# Altium schematic symbol library Regulator_Switching.SchLib: 1070 symbols (part 9 of 9)
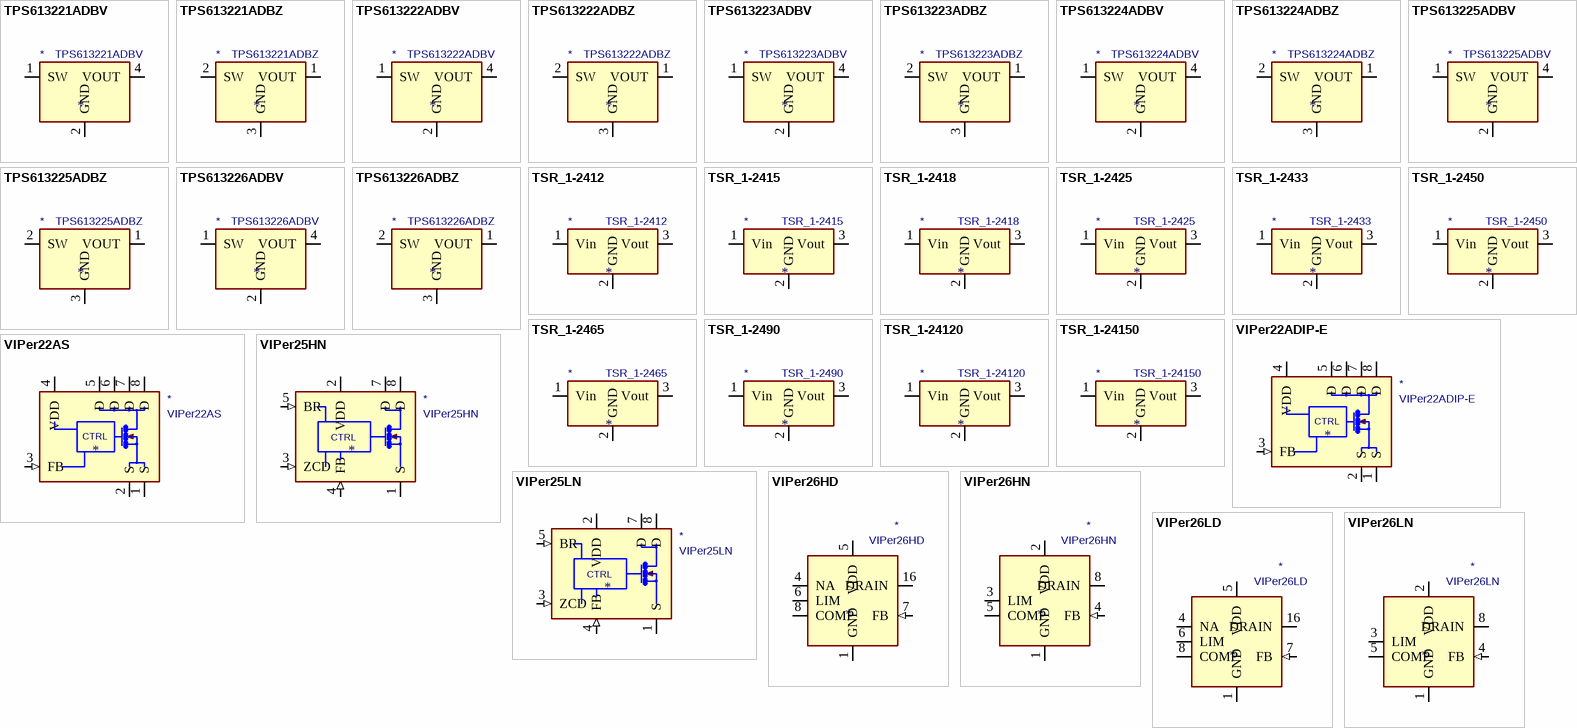
[diagram p34: symbols TPS613221ADBV to VIPer26LN]

## TPS613223ADBV
designator *  value TPS613223ADBV
ki_keywords: Boost converter; ki_description: 750mA Step-Up Converter, 2V Output Voltage, 0.9-5.5V Input Voltage, SOT-23-5; ki_fp_filters: SOT?23*; Footprint: Package_TO_SOT_SMD:SOT-23-5; Supplier: http://www.ti.com/lit/ds/symlink/tps61322.pdf
footprint SOT-23-5
pins: 1 SW (power), 2 GND (power), 3 NC (in) hidden, 4 VOUT (power), 5 NC (in) hidden

## TPS613223ADBZ
designator *  value TPS613223ADBZ
ki_keywords: Boost converter; ki_description: 750mA Step-Up Converter, 2V Output Voltage, 0.9-5.5V Input Voltage, SOT-23; ki_fp_filters: SOT?23*; Footprint: Package_TO_SOT_SMD:SOT-23; Supplier: http://www.ti.com/lit/ds/symlink/tps61322.pdf
footprint SOT-23
pins: 1 VOUT (power), 2 SW (power), 3 GND (power)

## TPS613224ADBV
designator *  value TPS613224ADBV
ki_keywords: Boost converter; ki_description: 750mA Step-Up Converter, 2.5V Output Voltage, 0.9-5.5V Input Voltage, SOT-23-5; ki_fp_filters: SOT?23*; Footprint: Package_TO_SOT_SMD:SOT-23-5; Supplier: http://www.ti.com/lit/ds/symlink/tps61322.pdf
footprint SOT-23-5
pins: 1 SW (power), 2 GND (power), 3 NC (in) hidden, 4 VOUT (power), 5 NC (in) hidden

## TPS613224ADBZ
designator *  value TPS613224ADBZ
ki_keywords: Boost converter; ki_description: 750mA Step-Up Converter, 2.5V Output Voltage, 0.9-5.5V Input Voltage, SOT-23; ki_fp_filters: SOT?23*; Footprint: Package_TO_SOT_SMD:SOT-23; Supplier: http://www.ti.com/lit/ds/symlink/tps61322.pdf
footprint SOT-23
pins: 1 VOUT (power), 2 SW (power), 3 GND (power)

## TPS613225ADBV
designator *  value TPS613225ADBV
ki_keywords: Boost converter; ki_description: 1.2A Step-Up Converter, 3V Output Voltage, 0.9-5.5V Input Voltage, SOT-23-5; ki_fp_filters: SOT?23*; Footprint: Package_TO_SOT_SMD:SOT-23-5; Supplier: http://www.ti.com/lit/ds/symlink/tps61322.pdf
footprint SOT-23-5
pins: 1 SW (power), 2 GND (power), 3 NC (in) hidden, 4 VOUT (power), 5 NC (in) hidden

## TPS613225ADBZ
designator *  value TPS613225ADBZ
ki_keywords: Boost converter; ki_description: 1.2A Step-Up Converter, 3V Output Voltage, 0.9-5.5V Input Voltage, SOT-23; ki_fp_filters: SOT?23*; Footprint: Package_TO_SOT_SMD:SOT-23; Supplier: http://www.ti.com/lit/ds/symlink/tps61322.pdf
footprint SOT-23
pins: 1 VOUT (power), 2 SW (power), 3 GND (power)

## TPS613226ADBV
designator *  value TPS613226ADBV
ki_keywords: Boost converter; ki_description: 1.2A Step-Up Converter, 3.6V Output Voltage, 0.9-5.5V Input Voltage, SOT-23-5; ki_fp_filters: SOT?23*; Footprint: Package_TO_SOT_SMD:SOT-23-5; Supplier: http://www.ti.com/lit/ds/symlink/tps61322.pdf
footprint SOT-23-5
pins: 1 SW (power), 2 GND (power), 3 NC (in) hidden, 4 VOUT (power), 5 NC (in) hidden

## TPS613226ADBZ
designator *  value TPS613226ADBZ
ki_keywords: Boost converter; ki_description: 1.2A Step-Up Converter, 3.6V Output Voltage, 0.9-5.5V Input Voltage, SOT-23; ki_fp_filters: SOT?23*; Footprint: Package_TO_SOT_SMD:SOT-23; Supplier: http://www.ti.com/lit/ds/symlink/tps61322.pdf
footprint SOT-23
pins: 1 VOUT (power), 2 SW (power), 3 GND (power)

## TSR_1-2412
designator *  value TSR_1-2412
ki_keywords: dc-dc traco buck; ki_description: 1A step-down regulator module, fixed 1.2V output voltage, 6-36V input voltage, -40°C to +85°C temperature range, TO-220 compatible LM78xx replacement; ki_fp_filters: Converter*DCDC*TRACO*TSR?1*; Footprint: Converter_DCDC:Converter_DCDC_TRACO_TSR-1_THT; Supplier: http://www.tracopower.com/products/tsr1.pdf
footprint Converter_DCDC_TRACO_TSR-1_THT
pins: 1 Vin (power), 2 GND (power), 3 Vout (power)

## TSR_1-2415
designator *  value TSR_1-2415
ki_keywords: dc-dc traco buck; ki_description: 1A step-down regulator module, fixed 1.5V output voltage, 6-36V input voltage, -40°C to +85°C temperature range, TO-220 compatible LM78xx replacement; ki_fp_filters: Converter*DCDC*TRACO*TSR?1*; Footprint: Converter_DCDC:Converter_DCDC_TRACO_TSR-1_THT; Supplier: http://www.tracopower.com/products/tsr1.pdf
footprint Converter_DCDC_TRACO_TSR-1_THT
pins: 1 Vin (power), 2 GND (power), 3 Vout (power)

## TSR_1-2418
designator *  value TSR_1-2418
ki_keywords: dc-dc traco buck; ki_description: 1A step-down regulator module, fixed 1.8V output voltage, 6-36V input voltage, -40°C to +85°C temperature range, TO-220 compatible LM78xx replacement; ki_fp_filters: Converter*DCDC*TRACO*TSR?1*; Footprint: Converter_DCDC:Converter_DCDC_TRACO_TSR-1_THT; Supplier: http://www.tracopower.com/products/tsr1.pdf
footprint Converter_DCDC_TRACO_TSR-1_THT
pins: 1 Vin (power), 2 GND (power), 3 Vout (power)

## TSR_1-2425
designator *  value TSR_1-2425
ki_keywords: dc-dc traco buck; ki_description: 1A step-down regulator module, fixed 2.5V output voltage, 6-36V input voltage, -40°C to +85°C temperature range, TO-220 compatible LM78xx replacement; ki_fp_filters: Converter*DCDC*TRACO*TSR?1*; Footprint: Converter_DCDC:Converter_DCDC_TRACO_TSR-1_THT; Supplier: http://www.tracopower.com/products/tsr1.pdf
footprint Converter_DCDC_TRACO_TSR-1_THT
pins: 1 Vin (power), 2 GND (power), 3 Vout (power)

## TSR_1-2433
designator *  value TSR_1-2433
ki_keywords: dc-dc traco buck; ki_description: 1A step-down regulator module, fixed 3.3V output voltage, 5-36V input voltage, -40°C to +85°C temperature range, TO-220 compatible LM78xx replacement; ki_fp_filters: Converter*DCDC*TRACO*TSR?1*; Footprint: Converter_DCDC:Converter_DCDC_TRACO_TSR-1_THT; Supplier: http://www.tracopower.com/products/tsr1.pdf
footprint Converter_DCDC_TRACO_TSR-1_THT
pins: 1 Vin (power), 2 GND (power), 3 Vout (power)

## TSR_1-2450
designator *  value TSR_1-2450
ki_keywords: dc-dc traco buck; ki_description: 1A step-down regulator module, fixed 5V output voltage, 5-36V input voltage, -40°C to +85°C temperature range, TO-220 compatible LM78xx replacement; ki_fp_filters: Converter*DCDC*TRACO*TSR?1*; Footprint: Converter_DCDC:Converter_DCDC_TRACO_TSR-1_THT; Supplier: http://www.tracopower.com/products/tsr1.pdf
footprint Converter_DCDC_TRACO_TSR-1_THT
pins: 1 Vin (power), 2 GND (power), 3 Vout (power)

## TSR_1-2465
designator *  value TSR_1-2465
ki_keywords: dc-dc traco buck; ki_description: 1A step-down regulator module, fixed 6.5V output voltage, 9-36V input voltage, -40°C to +85°C temperature range, TO-220 compatible LM78xx replacement; ki_fp_filters: Converter*DCDC*TRACO*TSR?1*; Footprint: Converter_DCDC:Converter_DCDC_TRACO_TSR-1_THT; Supplier: http://www.tracopower.com/products/tsr1.pdf
footprint Converter_DCDC_TRACO_TSR-1_THT
pins: 1 Vin (power), 2 GND (power), 3 Vout (power)

## TSR_1-2490
designator *  value TSR_1-2490
ki_keywords: dc-dc traco buck; ki_description: 1A step-down regulator module, fixed 9V output voltage, 2-36V input voltage, -40°C to +85°C temperature range, TO-220 compatible LM78xx replacement; ki_fp_filters: Converter*DCDC*TRACO*TSR?1*; Footprint: Converter_DCDC:Converter_DCDC_TRACO_TSR-1_THT; Supplier: http://www.tracopower.com/products/tsr1.pdf
footprint Converter_DCDC_TRACO_TSR-1_THT
pins: 1 Vin (power), 2 GND (power), 3 Vout (power)

## TSR_1-24120
designator *  value TSR_1-24120
ki_keywords: dc-dc traco buck; ki_description: 1A step-down regulator module, fixed 12V output voltage, 5-36V input voltage, -40°C to +85°C temperature range, TO-220 compatible LM78xx replacement; ki_fp_filters: Converter*DCDC*TRACO*TSR?1*; Footprint: Converter_DCDC:Converter_DCDC_TRACO_TSR-1_THT; Supplier: http://www.tracopower.com/products/tsr1.pdf
footprint Converter_DCDC_TRACO_TSR-1_THT
pins: 1 Vin (power), 2 GND (power), 3 Vout (power)

## TSR_1-24150
designator *  value TSR_1-24150
ki_keywords: dc-dc traco buck; ki_description: 1A step-down regulator module, fixed 15V output voltage, 8-36V input voltage, -40°C to +85°C temperature range, TO-220 compatible LM78xx replacement; ki_fp_filters: Converter*DCDC*TRACO*TSR?1*; Footprint: Converter_DCDC:Converter_DCDC_TRACO_TSR-1_THT; Supplier: http://www.tracopower.com/products/tsr1.pdf
footprint Converter_DCDC_TRACO_TSR-1_THT
pins: 1 Vin (power), 2 GND (power), 3 Vout (power)

## VIPer22ADIP-E
designator *  value VIPer22ADIP-E
ki_keywords: SMPS; ki_description: Low power OFF-line SMPS primary switcher; ki_fp_filters: DIP*W7.62mm*; Footprint: Package_DIP:DIP-8_W7.62mm; Supplier: http://www.st.com/web/en/resource/technical/document/datasheet/CD00087939.pdf
footprint DIP-8_W7.62mm
pins: 1 S, 2 S, 3 FB (in), 4 VDD (power), 5 D, 6 D, 7 D, 8 D
text: CTRL

## VIPer22AS
designator *  value VIPer22AS
ki_keywords: SMPS; ki_description: Low power OFF-line SMPS primary switcher; ki_fp_filters: SOIC*3.9x4.9mm*P1.27mm*; Footprint: Package_SO:SOIC-8_3.9x4.9mm_P1.27mm; Supplier: http://www.st.com/web/en/resource/technical/document/datasheet/CD00087939.pdf
footprint SOIC-8_3.9x4.9mm_P1.27mm
pins: 1 S, 2 S, 3 FB (in), 4 VDD (power), 5 D, 6 D, 7 D, 8 D
text: CTRL

## VIPer25HN
designator *  value VIPer25HN
ki_keywords: SMPS Controller with MOSFET 12W AC-DC; ki_description: 12W SMPS Controller, AC-DC, PDIP-7; ki_fp_filters: *PDIP*8B*; Footprint: Package_DIP:PowerIntegrations_PDIP-8B; Supplier: http://www.st.com/internet/com/TECHNICAL_RESOURCES/TECHNICAL_LITERATURE/DATASHEET/CD00231127.pdf
footprint PowerIntegrations_PDIP-8B
pins: 1 S, 2 VDD (power), 3 ZCD (in), 4 FB (in), 5 BR (in), 7 D, 8 D
text: CTRL

## VIPer25LN
designator *  value VIPer25LN
ki_keywords: SMPS Controller with MOSFET 12W AC-DC; ki_description: 12W SMPS Controller, AC-DC, PDIP-7; ki_fp_filters: *PDIP*8B*; Footprint: Package_DIP:PowerIntegrations_PDIP-8B; Supplier: http://www.st.com/internet/com/TECHNICAL_RESOURCES/TECHNICAL_LITERATURE/DATASHEET/CD00231127.pdf
footprint PowerIntegrations_PDIP-8B
pins: 1 S, 2 VDD (power), 3 ZCD (in), 4 FB (in), 5 BR (in), 7 D, 8 D
text: CTRL

## VIPer26HD
designator *  value VIPer26HD
ki_keywords: SMPS Controller with MOSFET; ki_description: 800V, 10-20W, 115kHz, SMPS Controller, SOIC-16; ki_fp_filters: SOIC*3.9x9.9mm*P1.27mm*; Footprint: Package_SO:SOIC-16_3.9x9.9mm_P1.27mm; Supplier: https://www.st.com/resource/en/datasheet/viper26.pdf
footprint SOIC-16_3.9x9.9mm_P1.27mm
pins: 1 GND (power), 2 GND hidden, 3 NC (in) hidden, 4 NA, 5 VDD (power), 6 LIM, 7 FB (in), 8 COMP, 9 NC (in) hidden, 10 NC (in) hidden, 11 NC (in) hidden, 12 NC (in) hidden, 13 DRAIN hidden, 14 DRAIN hidden, 15 DRAIN hidden, 16 DRAIN

## VIPer26HN
designator *  value VIPer26HN
ki_keywords: SMPS Controller with MOSFET; ki_description: 800V, 10-20W, 115kHz, SMPS Controller, DIP-7; ki_fp_filters: DIP*N6*W7.62mm*; Footprint: Package_DIP:DIP-8-N6_W7.62mm; Supplier: https://www.st.com/resource/en/datasheet/viper26.pdf
footprint DIP-8-N6_W7.62mm
pins: 1 GND (power), 2 VDD (power), 3 LIM, 4 FB (in), 5 COMP, 7 DRAIN hidden, 8 DRAIN

## VIPer26LD
designator *  value VIPer26LD
ki_keywords: SMPS Controller with MOSFET; ki_description: 800V, 10-20W, 60kHz, SMPS Controller, SOIC-16; ki_fp_filters: SOIC*3.9x9.9mm*P1.27mm*; Footprint: Package_SO:SOIC-16_3.9x9.9mm_P1.27mm; Supplier: https://www.st.com/resource/en/datasheet/viper26.pdf
footprint SOIC-16_3.9x9.9mm_P1.27mm
pins: 1 GND (power), 2 GND hidden, 3 NC (in) hidden, 4 NA, 5 VDD (power), 6 LIM, 7 FB (in), 8 COMP, 9 NC (in) hidden, 10 NC (in) hidden, 11 NC (in) hidden, 12 NC (in) hidden, 13 DRAIN hidden, 14 DRAIN hidden, 15 DRAIN hidden, 16 DRAIN

## VIPer26LN
designator *  value VIPer26LN
ki_keywords: SMPS Controller with MOSFET; ki_description: 800V, 10-20W, 60kHz, SMPS Controller, DIP-7; ki_fp_filters: DIP*N6*W7.62mm*; Footprint: Package_DIP:DIP-8-N6_W7.62mm; Supplier: https://www.st.com/resource/en/datasheet/viper26.pdf
footprint DIP-8-N6_W7.62mm
pins: 1 GND (power), 2 VDD (power), 3 LIM, 4 FB (in), 5 COMP, 7 DRAIN hidden, 8 DRAIN